# Altium footprint library ESKDPcbLib.PcbLib: 608 footprints (part 35 of 38)
Each footprint in its own frame and in the unit in brackets; x right, y up, seen from the top. Pads: shape width x height; smd on the part's side, far side on the other; paste and mask are expansions set on the pad; w line width, h text height; cw(c..) or ccw(c..) is an arc to the next point about the centre after c.
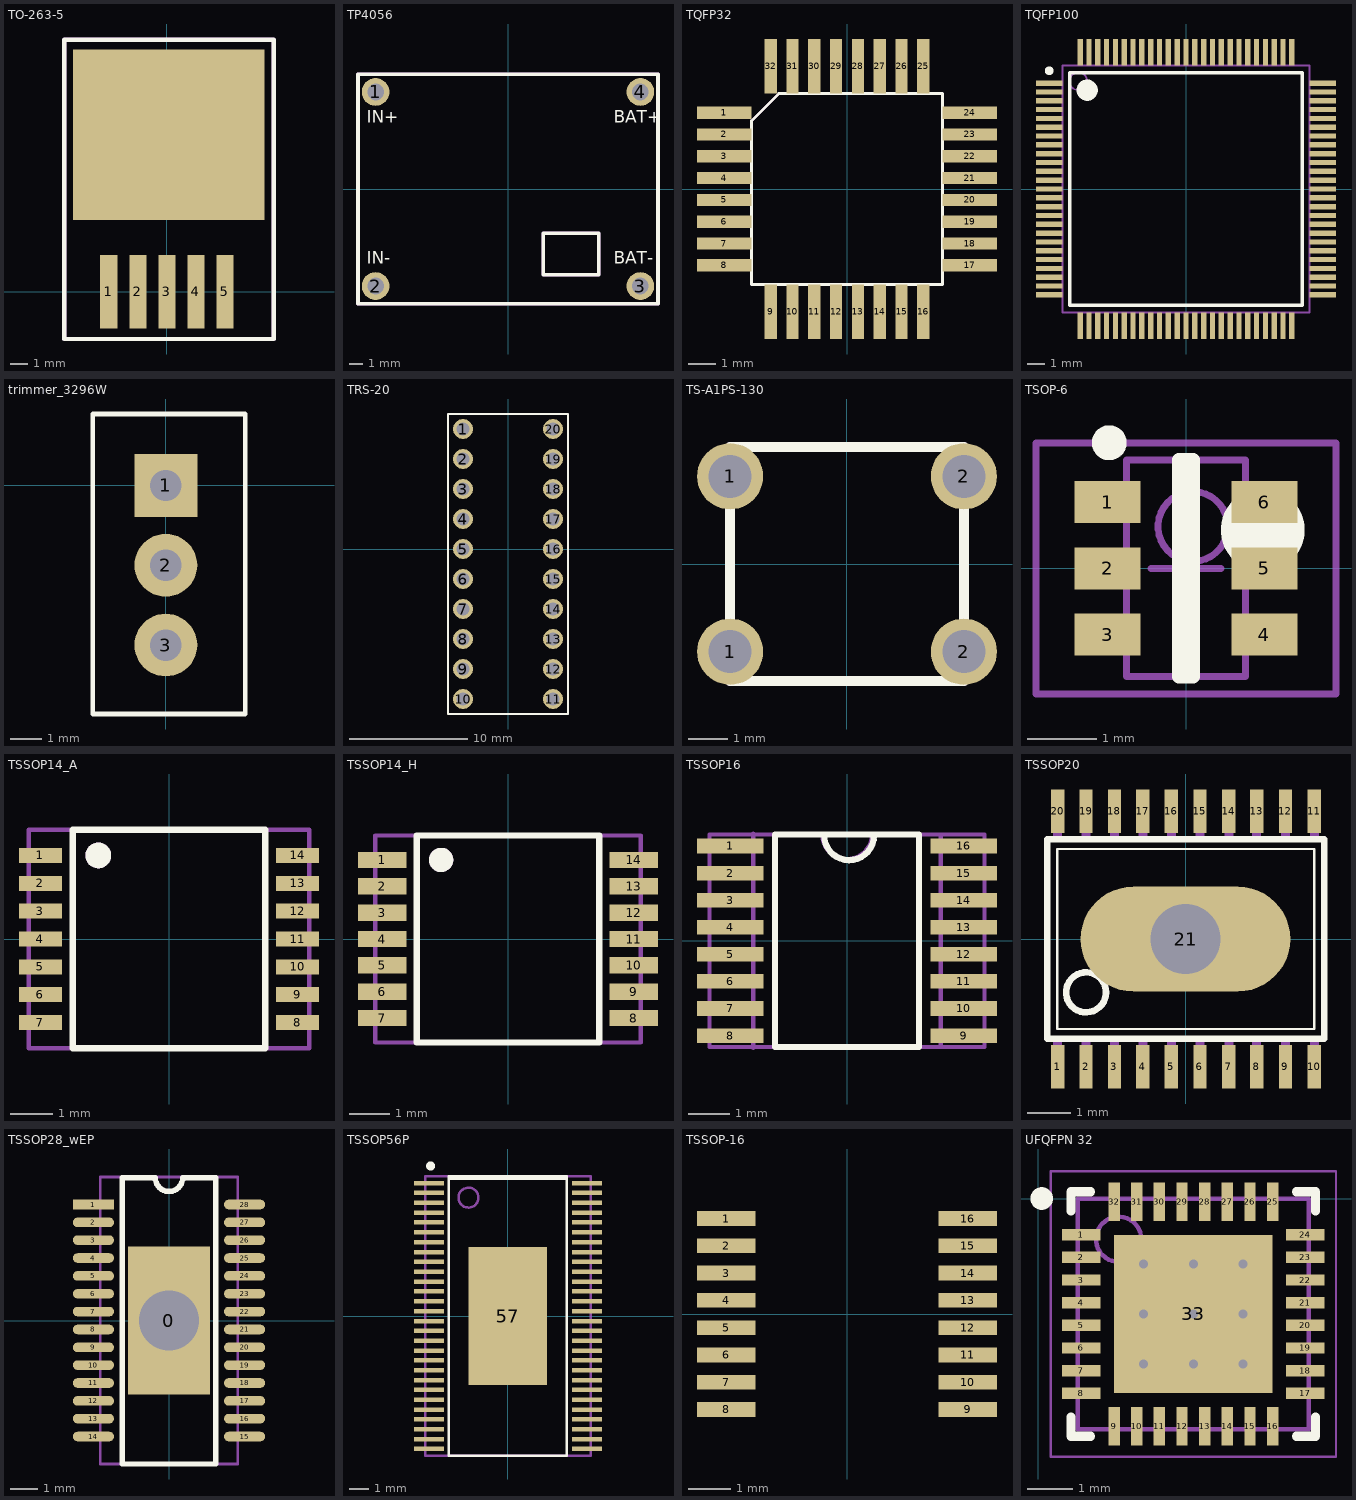
[diagram p34: the footprints below, top view; thin cyan lines are the x and y axes]

## TO-263-5 [mm]
pads (6):
  rect 1x4.3 smd: 1(-3.4,0) 2(-1.7,0) 3(0,0) 4(1.7,0) 5(3.4,0)
  rect 11.2x10 smd: ""(0.1,9.2)
Top Overlay:
  lines w0.254: -6,-2.75 -6,14.75 6.25,14.75 6.25,-2.75 -6,-2.75
Mechanical 7:
  lines w0.254: -6,-2.75 6.25,-2.75 6.25,14.75 -6,14.75 -6,-2.75
Mechanical 10:
  text ".Comment" at -5.65,15.35 h1
  text ".Designator" at -5.65,16.35 h1
3D body "TO-263-5.STEP": height 4.56, standoff 0, extent -5.08,-0.227 5.08,13.787

## TP4056 [mm]
pads (4):
  round 2 hole 1.2: 1(-9.525,6.985) 2(-9.525,-6.985) 3(9.525,-6.985) 4(9.525,6.985)
Top Overlay:
  lines w0.254: -10.795,-8.255 -10.795,8.255 10.795,8.255 10.795,-8.255 -10.795,-8.255 ; 2.54,-6.175 2.54,-4.175 2.54,-3.175 6.54,-3.175 6.54,-6.175 2.54,-6.175
  text "BAT+" at 7.62,4.445 h1.52
  text "BAT-" at 7.62,-5.715 h1.52
  text "IN+" at -10.16,4.445 h1.52
  text "IN-" at -10.16,-5.715 h1.52
Mechanical 7:
  lines w0.254: -10.795,-8.255 -10.795,8.255 10.795,8.255 10.795,-8.255 -10.795,-8.255 ; 2.54,-6.175 2.54,-3.175 6.54,-3.175 6.54,-6.175 2.54,-6.175
Mechanical 10:
  text ".Designator" at 3,7.5 h1
  text ".Comment" at 3,6.5 h1

## TQFP32 [mm]
pads (32):
  rect 2x0.45 smd: 1(-4.5,2.8) 2(-4.5,2) 3(-4.5,1.2) 4(-4.5,0.4) 5(-4.5,-0.4) 6(-4.5,-1.2) 7(-4.5,-2) 8(-4.5,-2.8) 17(4.5,-2.8) 18(4.5,-2) 19(4.5,-1.2) 20(4.5,-0.4) 21(4.5,0.4) 22(4.5,1.2) 23(4.5,2) 24(4.5,2.8)
  rect 0.45x2 smd: 9(-2.8,-4.5) 10(-2,-4.5) 11(-1.2,-4.5) 12(-0.4,-4.5) 13(0.4,-4.5) 14(1.2,-4.5) 15(2,-4.5) 16(2.8,-4.5) 25(2.8,4.5) 26(2,4.5) 27(1.2,4.5) 28(0.4,4.5) 29(-0.4,4.5) 30(-1.2,4.5) 31(-2,4.5) 32(-2.8,4.5)
Top Overlay:
  lines w0.1: -3.5,-3.5 -3.5,2.5 -2.5,3.5 3.5,3.5 3.5,-3.5 -3.5,-3.5
Mechanical 7:
  lines w0.1: -3.5,-3.5 -3.5,2.5 -2.5,3.5 3.5,3.5 3.5,-3.5 -3.5,-3.5
Mechanical 10:
  text ".Designator" at 6,3.8 h1.52
  text ".Comment" at 6,5.8 h1.52
3D body "TQFP32.step": height 1.1, standoff -0.01, extent -4.8,-4.8 4.8,4.8

## TQFP100 [mm] "TSQFP, 100-Leads, Body 14,00x14,00mm, Pitch 0,50mm, IPC Medium Density"
height 1.2
pads (100):
  rect 1.5x0.3 smd: 1(-7.75,6) 2(-7.75,5.5) 3(-7.75,5) 4(-7.75,4.5) 5(-7.75,4) 6(-7.75,3.5) 7(-7.75,3) 8(-7.75,2.5) 9(-7.75,2) 10(-7.75,1.5) 11(-7.75,1) 12(-7.75,0.5) 13(-7.75,0) 14(-7.75,-0.5) 15(-7.75,-1) 16(-7.75,-1.5) 17(-7.75,-2) 18(-7.75,-2.5) 19(-7.75,-3) 20(-7.75,-3.5) 21(-7.75,-4) 22(-7.75,-4.5) 23(-7.75,-5) 24(-7.75,-5.5) 25(-7.75,-6) 51(7.75,-6) 52(7.75,-5.5) 53(7.75,-5) 54(7.75,-4.5) 55(7.75,-4) 56(7.75,-3.5) 57(7.75,-3) 58(7.75,-2.5) 59(7.75,-2) 60(7.75,-1.5) 61(7.75,-1) 62(7.75,-0.5) 63(7.75,0) 64(7.75,0.5) 65(7.75,1) 66(7.75,1.5) 67(7.75,2) 68(7.75,2.5) 69(7.75,3) 70(7.75,3.5) 71(7.75,4) 72(7.75,4.5) 73(7.75,5) 74(7.75,5.5) 75(7.75,6)
  rect 0.3x1.5 smd: 26(-6,-7.75) 27(-5.5,-7.75) 28(-5,-7.75) 29(-4.5,-7.75) 30(-4,-7.75) 31(-3.5,-7.75) 32(-3,-7.75) 33(-2.5,-7.75) 34(-2,-7.75) 35(-1.5,-7.75) 36(-1,-7.75) 37(-0.5,-7.75) 38(0,-7.75) 39(0.5,-7.75) 40(1,-7.75) 41(1.5,-7.75) 42(2,-7.75) 43(2.5,-7.75) 44(3,-7.75) 45(3.5,-7.75) 46(4,-7.75) 47(4.5,-7.75) 48(5,-7.75) 49(5.5,-7.75) 50(6,-7.75) 76(6,7.75) 77(5.5,7.75) 78(5,7.75) 79(4.5,7.75) 80(4,7.75) 81(3.5,7.75) 82(3,7.75) 83(2.5,7.75) 84(2,7.75) 85(1.5,7.75) 86(1,7.75) 87(0.5,7.75) 88(0,7.75) 89(-0.5,7.75) 90(-1,7.75) 91(-1.5,7.75) 92(-2,7.75) 93(-2.5,7.75) 94(-3,7.75) 95(-3.5,7.75) 96(-4,7.75) 97(-4.5,7.75) 98(-5,7.75) 99(-5.5,7.75) 100(-6,7.75)
Top Overlay:
  circle w0.6: c-5.6,5.6 r0.3
  circle w0.25: c-7.75,6.7 r0.125
  lines w0.2: -6.6,-6.6 6.6,-6.6 6.6,6.6 -6.6,6.6 -6.6,-6.6
Mechanical 7:
  circle w0.1: c-6.1,6.1 r0.5
  lines w0.1: -7,-7 7,-7 7,7 -7,7 -7,-7
Mechanical 10:
  text ".Designator" at 2.5,10 h1.52
  text ".Comment" at 2.5,12.5 h1.52
3D body "TQFP100_Grid_0_5.STEP": height 1.2, standoff 0, extent -8,-8 8,8

## trimmer_3296W [mm]
pads (3):
  rect 2x2 hole 1: 1(0,0)
  round 2 hole 1: 2(0,-2.54) 3(0,-5.08)
Top Overlay:
  lines w0.15: -2.325,-7.275 2.525,-7.275 2.525,2.275 -2.325,2.275 -2.325,-7.275
Mechanical 7:
  lines w0.1: -2.325,-7.275 -2.325,2.275 2.5,2.275 2.5,-7.275 -2.325,-7.275
Mechanical 10:
  text ".Designator" at 3.125,0.925 h1
  text ".Comment" at 3.125,-0.075 h1
3D body "3296W.STEP": height 11.55, standoff -1.6, extent -2.3,-7.265 2.5,2.265

## TRS-20 [mm]
pads (20):
  round 1.7 hole 1.1: 1(-3.81,10.16) 2(-3.81,7.62) 3(-3.81,5.08) 4(-3.81,2.54) 5(-3.81,0) 6(-3.81,-2.54) 7(-3.81,-5.08) 8(-3.81,-7.62) 9(-3.81,-10.16) 10(-3.81,-12.7) 11(3.81,-12.7) 12(3.81,-10.16) 13(3.81,-7.62) 14(3.81,-5.08) 15(3.81,-2.54) 16(3.81,0) 17(3.81,2.54) 18(3.81,5.08) 19(3.81,7.62) 20(3.81,10.16)
Top Overlay:
  lines w0.15: -5.07,11.42 -5.07,-13.96 5.07,-13.96 5.07,11.42 ; -5.07,11.43 5.07,11.43
Mechanical 7:
  lines w0.1: -5.08,-13.97 5.08,-13.97 5.08,11.43 -5.08,11.43 -5.08,-13.97
Mechanical 10:
  text ".Designator" at 0,12.7 h1
  text ".Comment" at 0,15.24 h1

## TS-A1PS-130 [mm] "Тактовая кнопка"
pads (4):
  round 1.7 hole 1.1: 1(-3,-2.25) 1(-3,2.25) 2(3,-2.25) 2(3,2.25)
Top Overlay:
  lines w0.254: -3,-3 3,-3 3,3 -3,3 -3,-3
Mechanical 7:
  lines w0.254: -3,-3 3,-3 3,3 -3,3 -3,-3

## TSOP-6 [mm] "TSOP, 6-Leads, Body 3,1x1,7mm (max), Pitch 0,95mm, IPC Medium Density"
height 1.1
pads (6):
  rect 0.95x0.6 smd: 1(-1.125,0.95) 2(-1.125,0) 3(-1.125,-0.95) 4(1.125,-0.95) 5(1.125,0) 6(1.125,0.95)
Top Overlay:
  circle w0.6: c1.1,0.55 r0.3
  circle w0.25: c-1.1,1.8 r0.125
  lines w0.2: -0.1,-1.55 0.1,-1.55 0.1,1.55 -0.1,1.55 -0.1,-1.55
Mechanical 9:
  circle w0.1: c0.1,0.6 r0.5
  lines w0.1: -0.85,-1.55 0.85,-1.55 0.85,1.55 -0.85,1.55 -0.85,-1.55
Mechanical 15:
  lines w0.1: -0.5,0 0.5,0 ; 0,-0.5 0,0.5 ; -2.15,-1.8 2.15,-1.8 2.15,1.8 -2.15,1.8 -2.15,-1.8
3D body: height 1.1, standoff 0.01, extent -0.85,-1.55 0.85,1.55

## TSSOP14_A [mm]
height 1.1
pads (14):
  rect 1x0.35 smd: 1(-3,1.95) 2(-3,1.3) 3(-3,0.65) 4(-3,0) 5(-3,-0.65) 6(-3,-1.3) 7(-3,-1.95) 8(3,-1.95) 9(3,-1.3) 10(3,-0.65) 11(3,0) 12(3,0.65) 13(3,1.3) 14(3,1.95)
Top Overlay:
  circle w0.3: c-1.65,1.95 r0.15
  lines w0.15: -2.25,-2.55 -2.25,2.55 2.25,2.55 2.25,-2.55 -2.25,-2.55
Mechanical 7:
  circle w0.3: c-1.65,1.95 r0.15
  lines w0.1: -2.25,-2.55 -2.25,2.55 ; 2.25,-2.55 2.25,2.55 ; -3.275,-2.55 3.275,-2.55 3.275,2.55 -3.275,2.55 -3.275,-2.55
Mechanical 10:
  text ".Comment" at -1,-3.175 h0.6
  text ".Designator" at -1.2,2.925 h0.8
3D body: height 0.5, standoff 0, extent 2.25,-2.55 3.275,2.55
3D body: height 0.5, standoff 0, extent -3.275,-2.55 -2.25,2.55
3D body: height 1.1, standoff 0, extent -2.25,-2.55 2.25,2.55

## TSSOP14_H [mm]
height 1.1
pads (14):
  rect 1.2x0.4 smd: 1(-3.1,1.95) 2(-3.1,1.3) 3(-3.1,0.65) 4(-3.1,0) 5(-3.1,-0.65) 6(-3.1,-1.3) 7(-3.1,-1.95) 8(3.1,-1.95) 9(3.1,-1.3) 10(3.1,-0.65) 11(3.1,0) 12(3.1,0.65) 13(3.1,1.3) 14(3.1,1.95)
Top Overlay:
  circle w0.3: c-1.65,1.95 r0.15
  lines w0.15: -2.25,-2.55 2.25,-2.55 2.25,2.55 -2.25,2.55 -2.25,-2.55
Mechanical 7:
  circle w0.3: c-1.65,1.95 r0.15
  lines w0.1: -2.25,-2.55 -2.25,2.55 ; 2.25,-2.55 2.25,2.55 ; -3.275,-2.55 -3.275,2.55 3.275,2.55 3.275,-2.55 -3.275,-2.55
Mechanical 10:
  text ".Designator" at -1.2,2.925 h0.8
  text ".Comment" at -1,-3.175 h0.6
3D body: height 1.1, standoff 0, extent -2.25,-2.55 2.25,2.55
3D body: height 0.5, standoff 0, extent -3.275,-2.55 -2.25,2.55
3D body: height 0.5, standoff 0, extent 2.25,-2.55 3.275,2.55

## TSSOP16 [mm]
height 1.99
pads (16):
  rect 1.6x0.35 smd: 1(-2.8,2.275) 2(-2.8,1.625) 3(-2.8,0.975) 4(-2.8,0.325) 5(-2.8,-0.325) 6(-2.8,-0.975) 7(-2.8,-1.625) 8(-2.8,-2.275) 9(2.8,-2.275) 10(2.8,-1.625) 11(2.8,-0.975) 12(2.8,-0.325) 13(2.8,0.325) 14(2.8,0.975) 15(2.8,1.625) 16(2.8,2.275)
Top Overlay:
  lines w0.15: -0.55,2.535 ccw(c0.05,2.535) 0.65,2.525 ; -1.725,-2.55 -1.725,2.55 1.725,2.55 1.725,-2.55 -1.725,-2.55
Mechanical 7:
  lines w0.1: -2.25,-2.575 -2.25,2.575 ; -0.6,2.56 ccw(c0,2.56) 0.6,2.55 ; 2.25,-2.55 2.25,2.55 ; -3.3,-2.55 -3.3,2.55 3.3,2.55 3.3,-2.55 -3.3,-2.55
Mechanical 10:
  text ".Designator" at -1.23,3.46 h0.8
  text ".Comment" at -0.67,-3.72 h0.6
3D body: height 1.99, standoff 0, extent -2.25,-2.55 2.25,2.525
3D body: height 0.75, standoff 0, extent -3.3,-2.55 -2.25,2.525
3D body: height 0.75, standoff 0, extent 2.25,-2.55 3.3,2.525

## TSSOP20 [mil]
pads (21):
  rect 12x39 smd: 1(-115.16,-114.87) 2(-89.57,-114.87) 3(-63.98,-114.87) 4(-38.39,-114.87) 5(-12.8,-114.87) 6(13,-114.87) 7(39,-114.87) 8(64,-114.87) 9(90,-114.87) 10(116,-114.87) 11(116,115) 12(90,115) 13(64,115) 14(39,115) 15(13,115) 16(-12.8,115) 17(-38.39,115) 18(-63.98,115) 19(-89.57,115) 20(-115.16,115)
  oval 189x94.5 hole 63: 21(0,0)
Top Overlay:
  circle w6: c-89.59,-48 r18
  lines w2: -115.59,-80.87 116,-80.87 116,81 -115.59,81 -115.59,-80.87
  lines w6: -124.59,-89.87 125,-89.87 125,90 -124.59,90 -124.59,-89.87
Mechanical 16:
  rectangle: -119.16,-122.87 -111.16,-89.87
  rectangle: -93.57,-122.87 -85.57,-89.87
  rectangle: -67.98,-122.87 -59.98,-89.87
  rectangle: -42.39,-122.87 -34.39,-89.87
  rectangle: -16.8,-122.87 -8.8,-89.87
  rectangle: 9,-122.87 17,-89.87
  rectangle: 35,-122.87 43,-89.87
  rectangle: 60,-122.87 68,-89.87
  rectangle: 86,-122.87 94,-89.87
  rectangle: 112,-122.87 120,-89.87
  rectangle: 112,90 120,123
  rectangle: 86,90 94,123
  rectangle: 60,90 68,123
  rectangle: 35,90 43,123
  rectangle: 9,90 17,123
  rectangle: -16.8,90 -8.8,123
  rectangle: -42.39,90 -34.39,123
  rectangle: -67.98,90 -59.98,123
  rectangle: -93.57,90 -85.57,123
  rectangle: -119.16,90 -111.16,123

## TSSOP28_wEP [mm] "TSSOP28_with_Exposed_Pad"
pads (29):
  rect 3x5.4 hole 2.2 mask+0.1: 0(0,0)
  rect 1.5x0.35 smd: 1(-2.75,4.225)
  oval 1.5x0.35 smd: 2(-2.75,3.575) 3(-2.75,2.925) 4(-2.75,2.275) 5(-2.75,1.625) 6(-2.75,0.975) 7(-2.75,0.325) 8(-2.75,-0.325) 9(-2.75,-0.975) 10(-2.75,-1.625) 11(-2.75,-2.275) 12(-2.75,-2.925) 13(-2.75,-3.575) 14(-2.75,-4.225) 15(2.75,-4.225) 16(2.75,-3.575) 17(2.75,-2.925) 18(2.75,-2.275) 19(2.75,-1.625) 20(2.75,-0.975) 21(2.75,-0.325) 22(2.75,0.325) 23(2.75,0.975) 24(2.75,1.625) 25(2.75,2.275) 26(2.75,2.925) 27(2.75,3.575) 28(2.75,4.225)
Top Overlay:
  lines w0.2: -1.7,-5.225 -1.7,5.2 -0.5,5.2 ccw(c0,5.2) 0.5,5.2 1.7,5.2 1.7,-5.225 -1.7,-5.225
Mechanical 7:
  lines w0.1: -2.5,-5.225 2.5,-5.225 2.5,5.225 -2.5,5.225 -2.5,-5.225
Mechanical 9:
  lines w0.1: -2.5,5.2 -2.5,-5.225 2.5,-5.225 2.5,5.225 -2.5,5.225
3D body: height 1.2, standoff 0.05, extent -2.5,-5.225 2.5,5.225

## TSSOP56P [mil]
pads (57):
  rect 60x9 smd: 1(-157.48,266) 2(-157.48,247) 3(-157.48,227) 4(-157.48,207) 5(-157.48,188) 6(-157.48,168) 7(-157.48,148) 8(-157.48,128) 9(-157.48,109) 10(-157.48,89) 11(-157.48,69) 12(-157.48,50) 13(-157.48,30) 14(-157.48,10) 15(-157.48,-9.84) 16(-157.48,-29.53) 17(-157.48,-49.21) 18(-157.48,-68.9) 19(-157.48,-88.58) 20(-157.48,-108.27) 21(-157.48,-127.95) 22(-157.48,-147.64) 23(-157.48,-167.32) 24(-157.48,-187.01) 25(-157.48,-206.69) 26(-157.48,-226.38) 27(-157.48,-246.06) 28(-157.48,-265.75) 29(158,-265.75) 30(158,-246.06) 31(158,-226.38) 32(158,-206.69) 33(158,-187.01) 34(158,-167.32) 35(158,-147.64) 36(158,-127.95) 37(158,-108.27) 38(158,-88.58) 39(158,-68.9) 40(158,-49.21) 41(158,-29.53) 42(158,-9.84) 43(158,10) 44(158,30) 45(158,50) 46(158,69) 47(158,89) 48(158,109) 49(158,128) 50(158,148) 51(158,168) 52(158,188) 53(158,207) 54(158,227) 55(158,247) 56(158,266)
  rect 157.48x275.59 smd: 57(0,0)
Top Overlay:
  circle w10: c-154.53,300.2 r3.94
  lines w5: -118.11,274.61 118.11,274.61 ; -118.11,-279.53 -118.11,279.53 118.11,279.53 118.11,-279.53 -118.11,-279.53
Mechanical 7:
  circle w5: c-78.74,237 r20
  lines w5: -165.35,-279.53 -165.35,279.53 165.35,279.53 165.35,-279.53 -165.35,-279.53
3D body: height 23.62, standoff 1.97, extent 125.98,-275.59 165.35,275.59
3D body: height 23.62, standoff 1.97, extent -165.35,-275.59 -125.98,275.59
3D body: height 47.24, standoff 1.97, extent -125.98,-279.53 125.98,279.53

## TSSOP-16 [mm]
pads (16):
  rect 1.4x0.35 smd: 1(-2.875,2.275) 2(-2.875,1.625) 3(-2.875,0.975) 4(-2.875,0.325) 5(-2.875,-0.325) 6(-2.875,-0.975) 7(-2.875,-1.625) 8(-2.875,-2.275) 9(2.875,-2.275) 10(2.875,-1.625) 11(2.875,-0.975) 12(2.875,-0.325) 13(2.875,0.325) 14(2.875,0.975) 15(2.875,1.625) 16(2.875,2.275)
3D body: height 1, standoff 0, extent -3.2,-2.5 3.2,2.5

## UFQFPN 32 [mm]
pads (33):
  rect 0.85x0.25 smd: 1(0.954,-0.79) 2(0.954,-1.29) 3(0.954,-1.79) 4(0.954,-2.29) 5(0.954,-2.79) 6(0.954,-3.29) 7(0.954,-3.79) 8(0.954,-4.29) 17(5.904,-4.29) 18(5.904,-3.79) 19(5.904,-3.29) 20(5.904,-2.79) 21(5.904,-2.29) 22(5.904,-1.79) 23(5.904,-1.29) 24(5.904,-0.79)
  rect 0.25x0.85 smd: 9(1.679,-5.015) 10(2.179,-5.015) 11(2.679,-5.015) 12(3.179,-5.015) 13(3.679,-5.015) 14(4.179,-5.015) 15(4.679,-5.015) 16(5.179,-5.015) 25(5.179,-0.065) 26(4.679,-0.065) 27(4.179,-0.065) 28(3.679,-0.065) 29(3.179,-0.065) 30(2.679,-0.065) 31(2.179,-0.065) 32(1.679,-0.065)
  rect 3.5x3.5 smd: 33(3.429,-2.54)
via 2.329,-1.44 diameter 0.5 hole 0.2
via 3.429,-1.44 diameter 0.5 hole 0.2
via 4.529,-1.44 diameter 0.5 hole 0.2
via 2.329,-2.54 diameter 0.5 hole 0.2
via 3.429,-2.54 diameter 0.5 hole 0.2
via 4.529,-2.54 diameter 0.5 hole 0.2
via 2.329,-3.64 diameter 0.5 hole 0.2
via 3.429,-3.64 diameter 0.5 hole 0.2
via 4.529,-3.64 diameter 0.5 hole 0.2
Top Overlay:
  circle w0.25: c0.079,0.01 r0.125
  lines w0.2: 0.729,-4.815 0.729,-5.24 1.154,-5.24 ; 0.729,-0.265 0.729,0.16 1.154,0.16 ; 5.704,-5.24 6.129,-5.24 6.129,-4.815 ; 5.704,0.16 6.129,0.16 6.129,-0.265
Mechanical 9:
  circle w0.1: c1.779,-0.89 r0.5
  lines w0.1: 0.879,-5.09 0.879,0.01 5.979,0.01 5.979,-5.09 0.879,-5.09
Mechanical 15:
  lines w0.05: 0.279,-5.69 0.279,0.61 6.579,0.61 6.579,-5.69 0.279,-5.69
  lines w0.1: 2.929,-2.54 3.929,-2.54 ; 3.429,-3.04 3.429,-2.04
3D body: height 0.6, standoff 0, extent 0.879,-5.09 5.979,0.01